# Altium footprint library SDRdrum.PcbLib: 35 footprints (part 3 of 3)
Each footprint in its own frame and in the unit in brackets; x right, y up, seen from the top. Pads: shape width x height; smd on the part's side, far side on the other; paste and mask are expansions set on the pad; w line width, h text height; cw(c..) or ccw(c..) is an arc to the next point about the centre after c.
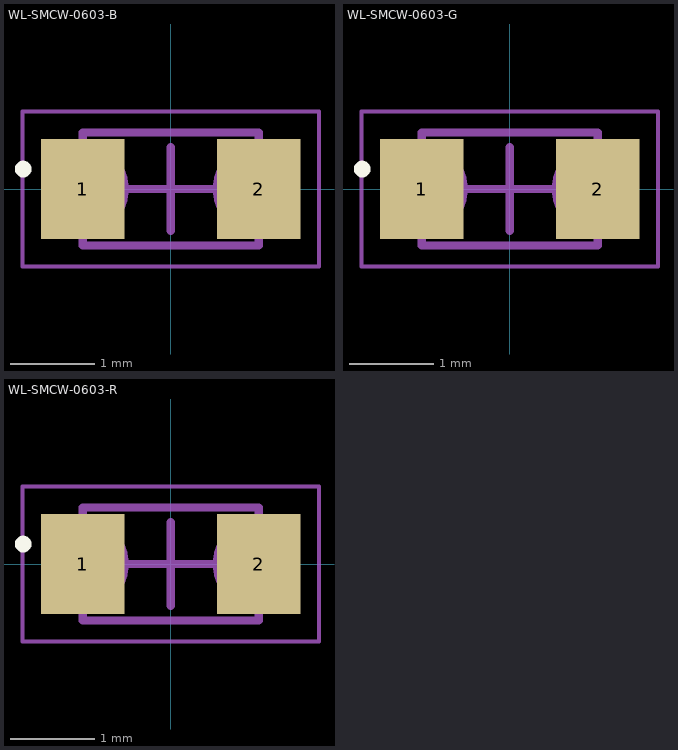
[diagram p2: the footprints below, top view; thin cyan lines are the x and y axes]

## WL-SMCW-0603-B [mm] "Chip Array, Concave, 2-Leads, Pitch 1.27mm,  Body 1.25x2.00mm,  IPC Medium Density"
height 0.7
pads (2):
  rect 1x1.2 smd: 1(-1.05,0) 2(1.05,0)
Top Overlay:
  circle w0.1: c-1.762,0.238 r0.05
Assembly Top:
  lines w0.1: -1.05,-0.675 1.05,-0.675 1.05,-0.5 cw(c1.05,0) 1.05,0.5 1.05,0.675 -1.05,0.675 -1.05,0.5 cw(c-1.05,0) -1.05,-0.5 -1.05,-0.675
Courtyard Top:
  lines w0.05: -1.77,-0.925 1.77,-0.925 1.77,0.925 -1.77,0.925 -1.77,-0.925
  lines w0.1: -0.5,0 0.5,0 ; 0,-0.5 0,0.5
3D body "CAC-127P125X200-2N.step": height 0.3, standoff 0, extent -1.1,-0.675 1.1,0.675
3D body: height 0.7, standoff 0, extent -0.7,-0.6 0.7,0.6

## WL-SMCW-0603-G [mm] "Chip Array, Concave, 2-Leads, Pitch 1.27mm,  Body 1.25x2.00mm,  IPC Medium Density"
height 0.7
pads (2):
  rect 1x1.2 smd: 1(-1.05,0) 2(1.05,0)
Top Overlay:
  circle w0.1: c-1.762,0.238 r0.05
Assembly Top:
  lines w0.1: -1.05,-0.675 1.05,-0.675 1.05,-0.5 cw(c1.05,0) 1.05,0.5 1.05,0.675 -1.05,0.675 -1.05,0.5 cw(c-1.05,0) -1.05,-0.5 -1.05,-0.675
Courtyard Top:
  lines w0.05: -1.77,-0.925 1.77,-0.925 1.77,0.925 -1.77,0.925 -1.77,-0.925
  lines w0.1: -0.5,0 0.5,0 ; 0,-0.5 0,0.5
3D body "CAC-127P125X200-2N.step": height 0.3, standoff 0, extent -1.1,-0.675 1.1,0.675
3D body: height 0.7, standoff 0, extent -0.7,-0.6 0.7,0.6

## WL-SMCW-0603-R [mm] "Chip Array, Concave, 2-Leads, Pitch 1.27mm,  Body 1.25x2.00mm,  IPC Medium Density"
height 0.7
pads (2):
  rect 1x1.2 smd: 1(-1.05,0) 2(1.05,0)
Top Overlay:
  circle w0.1: c-1.762,0.238 r0.05
Assembly Top:
  lines w0.1: -1.05,-0.675 1.05,-0.675 1.05,-0.5 cw(c1.05,0) 1.05,0.5 1.05,0.675 -1.05,0.675 -1.05,0.5 cw(c-1.05,0) -1.05,-0.5 -1.05,-0.675
Courtyard Top:
  lines w0.05: -1.77,-0.925 1.77,-0.925 1.77,0.925 -1.77,0.925 -1.77,-0.925
  lines w0.1: -0.5,0 0.5,0 ; 0,-0.5 0,0.5
3D body "CAC-127P125X200-2N.step": height 0.3, standoff 0, extent -1.1,-0.675 1.1,0.675
3D body: height 0.7, standoff 0, extent -0.7,-0.6 0.7,0.6